# Altium footprint library Footprint-Lib-PhilsLab.PcbLib: 210 footprints (part 13 of 14)
Each footprint in its own frame and in the unit in brackets; x right, y up, seen from the top. Pads: shape width x height; smd on the part's side, far side on the other; paste and mask are expansions set on the pad; w line width, h text height; cw(c..) or ccw(c..) is an arc to the next point about the centre after c.
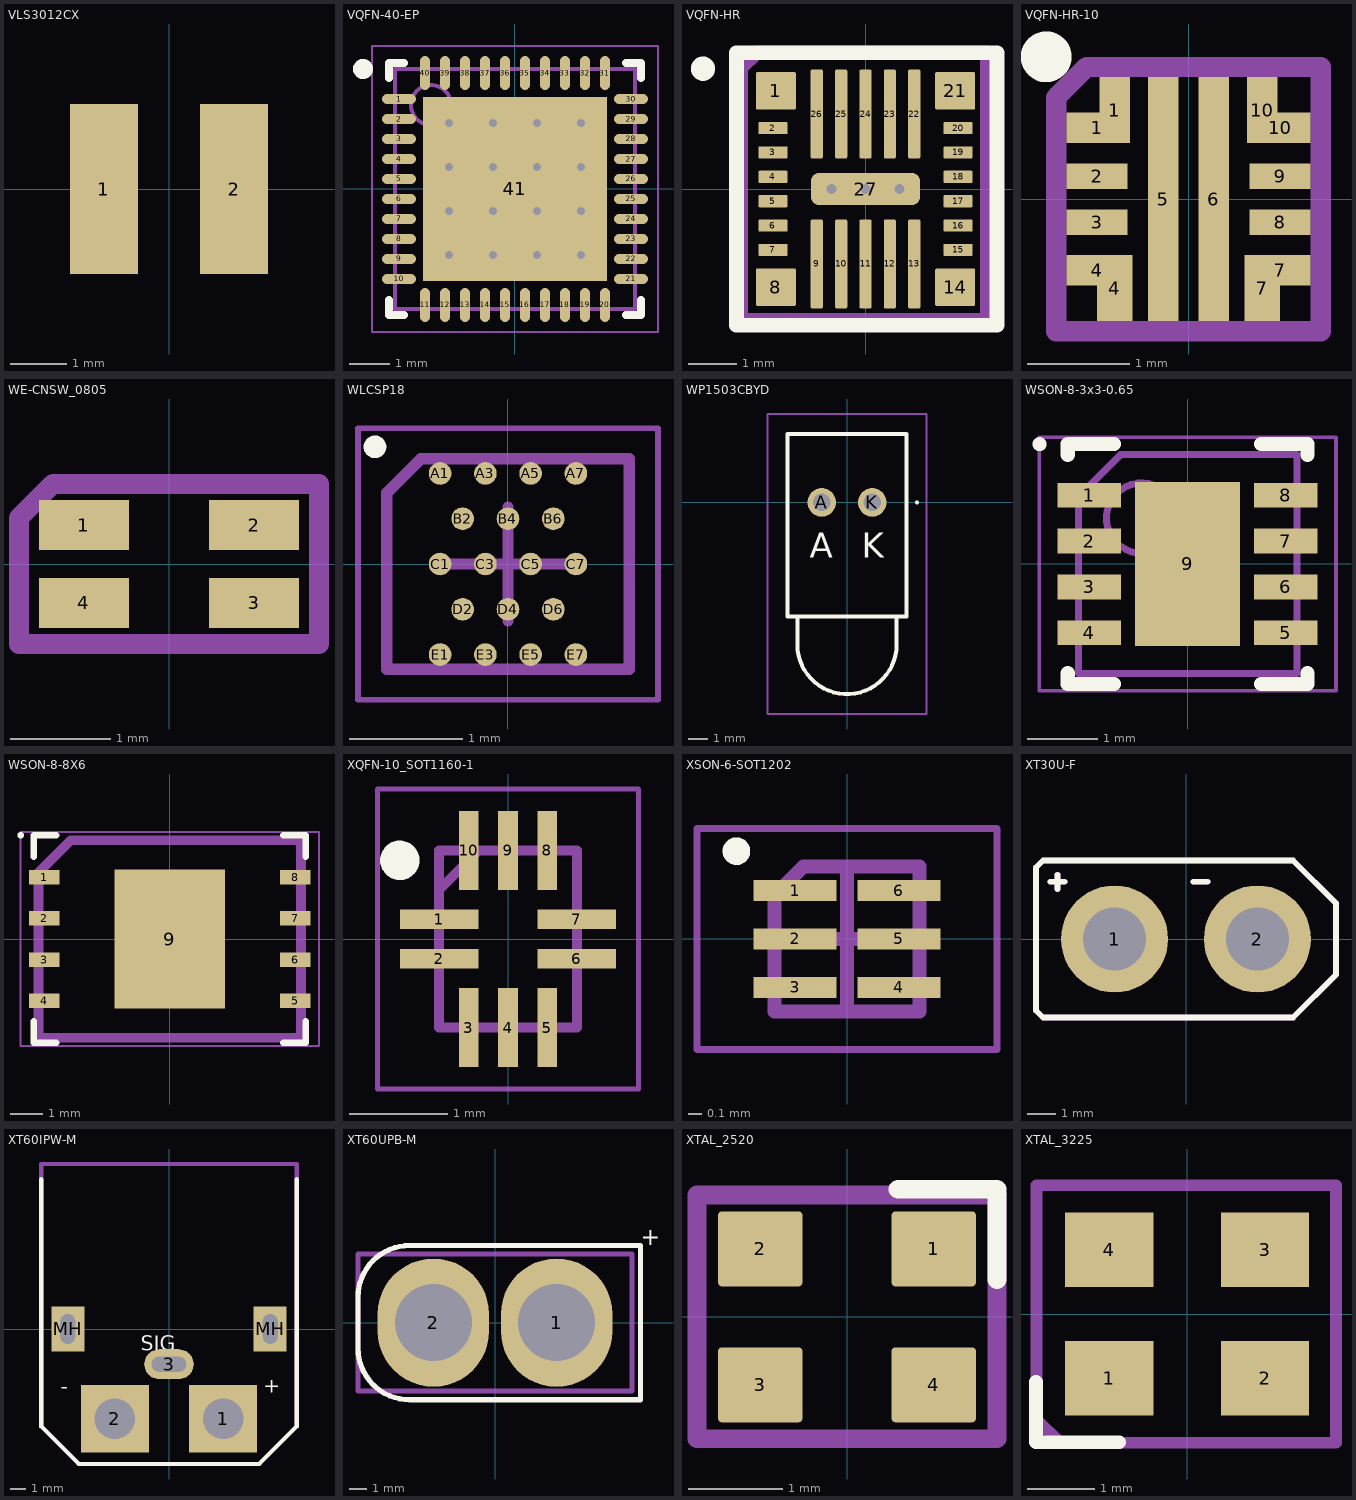
[diagram p12: the footprints below, top view; thin cyan lines are the x and y axes]

## VLS3012CX [mm]
pads (2):
  rect 1.2x3 smd: 1(-1.15,0) 2(1.15,0)
3D body "vls3012cx-1.step": height 1.21, standoff 0.01, extent -1.502,-1.509 1.502,1.509

## VQFN-40-EP [mm]
height 0.9
pads (41):
  oval 0.85x0.25 smd mask+0.2: 1(-2.9,2.25) 2(-2.9,1.75) 3(-2.9,1.25) 4(-2.9,0.75) 5(-2.9,0.25) 6(-2.9,-0.25) 7(-2.9,-0.75) 8(-2.9,-1.25) 9(-2.9,-1.75) 10(-2.9,-2.25) 21(2.9,-2.25) 22(2.9,-1.75) 23(2.9,-1.25) 24(2.9,-0.75) 25(2.9,-0.25) 26(2.9,0.25) 27(2.9,0.75) 28(2.9,1.25) 29(2.9,1.75) 30(2.9,2.25)
  oval 0.25x0.85 smd mask+0.2: 11(-2.25,-2.9) 12(-1.75,-2.9) 13(-1.25,-2.9) 14(-0.75,-2.9) 15(-0.25,-2.9) 16(0.25,-2.9) 17(0.75,-2.9) 18(1.25,-2.9) 19(1.75,-2.9) 20(2.25,-2.9) 31(2.25,2.9) 32(1.75,2.9) 33(1.25,2.9) 34(0.75,2.9) 35(0.25,2.9) 36(-0.25,2.9) 37(-0.75,2.9) 38(-1.25,2.9) 39(-1.75,2.9) 40(-2.25,2.9)
  rect 4.6x4.6 smd mask+0.2: 41(0,0)
via 1.65,-1.65 diameter 0.5 hole 0.2
via 0.55,-1.65 diameter 0.5 hole 0.2
via -0.55,-1.65 diameter 0.5 hole 0.2
via -1.65,-1.65 diameter 0.5 hole 0.2
via 1.65,-0.55 diameter 0.5 hole 0.2
via 0.55,-0.55 diameter 0.5 hole 0.2
via -0.55,-0.55 diameter 0.5 hole 0.2
via -1.65,-0.55 diameter 0.5 hole 0.2
via 1.65,0.55 diameter 0.5 hole 0.2
via 0.55,0.55 diameter 0.5 hole 0.2
via -0.55,0.55 diameter 0.5 hole 0.2
via -1.65,0.55 diameter 0.5 hole 0.2
via 1.65,1.65 diameter 0.5 hole 0.2
via 0.55,1.65 diameter 0.5 hole 0.2
via -0.55,1.65 diameter 0.5 hole 0.2
via -1.65,1.65 diameter 0.5 hole 0.2
Top Overlay:
  circle w0.25: c-3.8,3 r0.125
  lines w0.2: -3.15,-2.775 -3.15,-3.15 -2.775,-3.15 ; -3.15,2.775 -3.15,3.15 -2.775,3.15 ; 2.775,-3.15 3.15,-3.15 3.15,-2.775 ; 2.775,3.15 3.15,3.15 3.15,2.775
Mechanical 13:
  circle w0.1: c-2.1,2.1 r0.5
  lines w0.1: -3,-3 3,-3 3,3 -3,3 -3,-3
  text "'.Designator'" at -6.315,-1.4 h1
Mechanical 15:
  lines w0.05: -3.575,-3.575 3.575,-3.575 3.575,3.575 -3.575,3.575 -3.575,-3.575
  lines w0.1: -0.5,0 0.5,0 ; 0,-0.5 0,0.5
3D body "VQFN-40-EP.step": height 0.9, standoff 0, extent -3.001,-3.001 3.001,3.001

## VQFN-HR [mm]
pads (27):
  rrect10% 0.825x0.775 smd mask+0.07: 1(-1.84,2.015) 8(-1.84,-2.015) 14(1.84,-2.015) 21(1.84,2.015)
  rrect20% 0.6x0.25 smd mask+0.07: 2(-1.9,1.25) 3(-1.9,0.75) 4(-1.9,0.25) 5(-1.9,-0.25) 6(-1.9,-0.75) 7(-1.9,-1.25) 15(1.9,-1.25) 16(1.9,-0.75) 17(1.9,-0.25) 18(1.9,0.25) 19(1.9,0.75) 20(1.9,1.25)
  rrect20% 0.25x1.82 smd mask+0.07: 9(-1,-1.54) 10(-0.5,-1.54) 11(0,-1.54) 12(0.5,-1.54) 13(1,-1.54) 22(1,1.54) 23(0.5,1.54) 24(0,1.54) 25(-0.5,1.54) 26(-1,1.54)
  rrect50% 2.24x0.66 smd mask+0.07: 27(0,0)
via 0.7,0 diameter 0.5 hole 0.2
via -0.7,0 diameter 0.5 hole 0.2
via 0,0 diameter 0.5 hole 0.2
Top Overlay:
  circle w0.254: c-3.339,2.47 r0.121
  lines w0.3: -2.65,-2.8 2.7,-2.8 2.7,2.8 -2.65,2.8 -2.65,-2.8
Mechanical 13:
  circle w0.254: c-1.85,2.021 r0.117
  lines w0.3: -2.559,-2.7 2.5,-2.7 2.5,2.8 -2.247,2.8 -2.559,2.487 -2.559,-2.7
  text "'.Designator'" at -5.84,-0.925 h1
3D body "VQFN-HR.stp": height 0.9, standoff 0, extent -2,-2.25 2,2.25

## VQFN-HR-10 [mm]
pads (14):
  rect 0.6x0.3 smd: 1(-0.9,0.7) 4(-0.9,-0.7) 7(0.9,-0.7) 10(0.9,0.7)
  rect 0.3x0.65 smd: 1(-0.725,0.875) 10(0.725,0.875)
  rect 0.6x0.25 smd: 2(-0.9,0.225) 3(-0.9,-0.225) 8(0.9,-0.225) 9(0.9,0.225)
  rect 0.35x0.65 smd: 4(-0.725,-0.875) 7(0.725,-0.875)
  rect 0.3x2.4 smd: 5(-0.25,0) 6(0.25,0)
Top Overlay:
  circle w0.3: c-1.4,1.4 r0.1
Mechanical 13:
  lines w0.2: -1.3,-1.3 -1.3,0.2 -1.3,1 -1,1.3 1.3,1.3 1.3,-1.3 -1.3,-1.3
  text "'.Designator'" at -6.315,-1.4 h1
3D body "VQFN-HR-10P.STEP": height 1.01, standoff -0.01, extent -1.05,-1.05 1.05,1.05

## WE-CNSW_0805 [mm]
pads (4):
  rect 0.9x0.5 smd mask+0.05: 1(-0.85,0.39) 2(0.85,0.39) 3(0.85,-0.39) 4(-0.85,-0.39)
Mechanical 13:
  lines w0.2: -1.5,-0.8 -1.5,0.462 -1.162,0.8 1.5,0.8 1.5,-0.8 -1.5,-0.8
  text "'.Designator'" at -5.815,-0.9 h1
3D body "WE-CNSW_0805.stp": height 1.21, standoff 0.01, extent -1,-0.6 1,0.6

## WLCSP18 [mm]
height 0.59
pads (18):
  round 0.2 smd mask+0.03: A1(-0.6,0.8) A3(-0.2,0.8) A5(0.2,0.8) A7(0.6,0.8) B2(-0.4,0.4) B4(0,0.4) B6(0.4,0.4) C1(-0.6,0) C3(-0.2,0) C5(0.2,0) C7(0.6,0) D2(-0.4,-0.4) D4(0,-0.4) D6(0.4,-0.4) E1(-0.6,-0.8) E3(-0.2,-0.8) E5(0.2,-0.8) E7(0.6,-0.8)
Top Overlay:
  circle w0.1: c-1.175,1.035 r0.05
Mechanical 13:
  lines w0.1: -1.07,-0.93 -1.07,0.63 -0.77,0.93 1.07,0.93 1.07,-0.93 -1.07,-0.93
  text "'.Designator'" at -5.815,-0.9 h1
Mechanical 15:
  lines w0.05: -1.325,-1.2 1.325,-1.2 1.325,1.2 -1.325,1.2 -1.325,-1.2
  lines w0.1: -0.5,0 0.5,0 ; 0,-0.5 0,0.5
3D body "WLCSP18.step": height 0.59, standoff 0, extent -1.07,-0.93 1.07,0.93

## WP1503CBYD [mm]
pads (2):
  round 1.445 hole 0.889: A(-1.27,0) K(1.27,0)
Top Overlay:
  lines w0.1: 3.47,0 ccw(c3.52,0) 3.57,0 ccw(c3.52,0) 3.47,0
  lines w0.2: -2.5,-5.75 -2.5,-7.15 ccw(c0,-7.15) 2.5,-7.15 2.5,-5.75 ; -3,-5.75 3,-5.75 3,3.45 -3,3.45 -3,-5.75
  text "K" at 0.733,-2.775 h1.25
  text "A" at -1.867,-2.775 h1.25
Mechanical 13:
  lines w0.1: -2.5,-5.75 -2.5,-7.15 ccw(c0,-7.15) 2.5,-7.15 2.5,-5.75 ; -3,-5.75 3,-5.75 3,3.45 -3,3.45 -3,-5.75
  text "'.Designator'" at -7.231,-0.987 h1.25
Mechanical 15:
  lines w0.1: -4,-10.65 4,-10.65 4,4.45 -4,4.45 -4,-10.65
3D body "1503CB.STEP": height 6.01, standoff -3.49, extent -3,-9.75 3,3.45

## WSON-8-3x3-0.65 [mm] "SON, 8-Leads, Body 3.00x3.00mm, Pitch 0.65mm, Thermal Pad 2.33x1.49mm, IPC Medium Density"
height 1
pads (9):
  rect 0.9x0.35 smd: 1(-1.395,0.975) 2(-1.395,0.325) 3(-1.395,-0.325) 4(-1.395,-0.975) 5(1.395,-0.975) 6(1.395,-0.325) 7(1.395,0.325) 8(1.395,0.975)
  rect 1.49x2.33 smd: 9(0,0)
Top Overlay:
  circle w0.1: c-2.1,1.7 r0.05
  lines w0.2: -1.7,-1.55 -1.7,-1.7 -1.045,-1.7 ; -1.7,1.55 -1.7,1.7 -1.045,1.7 ; 1.045,-1.7 1.7,-1.7 1.7,-1.55 ; 1.045,1.7 1.7,1.7 1.7,1.55
Mechanical 13:
  circle w0.1: c-0.65,0.65 r0.5
  lines w0.1: -1.55,-1.55 1.55,-1.55 1.55,1.55 -0.95,1.55 -1.55,0.95 -1.55,-1.55
  text "'.Designator'" at -5.665,-0.317 h1
Mechanical 15:
  lines w0.05: -2.105,-1.8 -2.105,1.8 2.105,1.8 2.105,-1.8 -2.105,-1.8
  lines w0.1: -0.5,0 0.5,0 ; 0,-0.5 0,0.5
3D body "WSON-8-3x3-0.65.step": height 1, standoff 0, extent -1.551,-1.55 1.551,1.55

## WSON-8-8X6 [mm] "8-Pad WSON 8x6-mm (Package Code E) (Winbond)"
height 0.8
pads (9):
  rect 0.95x0.45 smd: 1(-3.87,1.905) 2(-3.87,0.635) 3(-3.87,-0.635) 4(-3.87,-1.905) 5(3.87,-1.905) 6(3.87,-0.635) 7(3.87,0.635) 8(3.87,1.905)
  rect 3.4x4.3 smd paste-1.7: 9(0,0)
Top Overlay:
  circle w0.1: c-4.6,3.2 r0.05
  lines w0.2: -4.2,-2.53 -4.2,-3.2 -3.495,-3.2 ; -4.2,2.53 -4.2,3.2 -3.495,3.2 ; 3.495,-3.2 4.2,-3.2 4.2,-2.53 ; 3.495,3.2 4.2,3.2 4.2,2.53
Top Paste:
  rectangle: -1.595,0.815 -0.665,2.045
  rectangle: -1.595,-0.615 -0.665,0.615
  rectangle: -1.595,-2.045 -0.665,-0.815
  rectangle: -0.465,0.815 0.465,2.045
  rectangle: -0.465,-0.615 0.465,0.615
  rectangle: -0.465,-2.045 0.465,-0.815
  rectangle: 0.665,0.815 1.595,2.045
  rectangle: 0.665,-0.615 1.595,0.615
  rectangle: 0.665,-2.045 1.595,-0.815
Mechanical 13:
  lines w0.3: -4.05,-3.05 -4.05,2.05 -3.05,3.05 4.05,3.05 4.05,-3.05 -4.05,-3.05
  text "'.Designator'" at -5.84,-0.925 h1
Mechanical 15:
  lines w0.05: -4.605,-3.3 -4.605,3.3 4.605,3.3 4.605,-3.3 -4.605,-3.3
  lines w0.1: -0.5,0 0.5,0 ; 0,-0.5 0,0.5
3D body "WSON-8-8X6.step": height 0.8, standoff 0, extent -4.051,-3.05 4.051,3.05

## XQFN-10_SOT1160-1 [mm]
pads (10):
  rect 0.8x0.2 smd mask+0.05: 1(-0.7,0.2) 2(-0.7,-0.2) 6(0.7,-0.2) 7(0.7,0.2)
  rect 0.2x0.8 smd mask+0.05: 3(-0.4,-0.9) 4(0,-0.9) 5(0.4,-0.9) 8(0.4,0.9) 9(0,0.9) 10(-0.4,0.9)
Top Overlay:
  circle w0.2: c-1.1,0.8 r0.1
Mechanical 13:
  lines w0.1: -0.7,0.5 -0.3,0.9 ; -0.7,-0.9 -0.7,0.9 0.7,0.9 0.7,-0.9 -0.7,-0.9
  text "'.Designator'" at -5.84,-0.925 h1
Mechanical 15:
  lines w0.05: -1.325,-1.525 -1.325,1.525 1.325,1.525 1.325,-1.525 -1.325,-1.525
3D body "NX3DV42GU,115.stp": height 0.5, standoff 0, extent -0.75,-0.95 0.75,0.95

## XSON-6-SOT1202 [mm] "SON, 6-Leads, Body 0.98x1.00mm, Pitch 0.35mm, IPC Medium Density"
height 0.35
pads (6):
  rect 0.6x0.15 smd mask+0.05: 1(-0.375,0.35) 2(-0.375,0) 3(-0.375,-0.35) 4(0.375,-0.35) 5(0.375,0) 6(0.375,0.35)
Top Overlay:
  circle w0.1: c-0.8,0.635 r0.05
Mechanical 13:
  lines w0.1: -0.525,-0.525 -0.525,0.316 -0.316,0.525 0.525,0.525 0.525,-0.525 -0.525,-0.525
  text "'.Designator'" at -5.84,-0.925 h1
Mechanical 15:
  lines w0.05: -1.085,-0.8 1.085,-0.8 1.085,0.8 -1.085,0.8 -1.085,-0.8
  lines w0.1: -0.5,0 0.5,0 ; 0,-0.5 0,0.5
3D body "XSON-6.step": height 0.39, standoff 0, extent -0.5,-0.5 0.5,0.5

## XT30U-F [mm]
pads (2):
  round 3.75 hole 2.2: 1(-2.5,0) 2(2.5,0)
Top Overlay:
  lines w0.2: -4.75,2 -4.25,2 ; -4.5,1.75 -4.5,2.25 ; 0.25,2 0.75,2 ; -5.25,-2.5 -5,-2.75 3.75,-2.75 5.25,-1.25 5.25,1.25 3.75,2.75 -5,2.75 -5.25,2.5 -5.25,0.25 -5.25,-2.5
Mechanical 13:
  lines w0.2: -4.75,2 -4.25,2 ; -4.5,1.75 -4.5,2.25 ; 0.25,2 0.75,2 ; -5.25,-2.5 -5,-2.75 3.75,-2.75 5.25,-1.25 5.25,1.25 3.75,2.75 -5,2.75 -5.25,2.5 -5.25,0.25 -5.25,-2.5
  text "'.Designator'" at -6.315,-1.4 h1
3D body "XT30U-F.step": height 12.61, standoff -2.99, extent -5.225,-2.625 5.225,2.625
3D body "XT30U-F.stp": height 0, standoff 0, extent 13.25,9.75 13.25,9.75

## XT60IPW-M [mm]
pads (5):
  rect 4.5x4.5 hole 2.7: 1(3.6,-6) 2(-3.6,-6)
  rrect100% 3.3x2 hole 1 slot 2.3 at 0 deg: 3(0,-2.35)
  rect 2.2x3 hole 1 slot 2 at 90 deg: MH(-6.75,0) MH(6.75,0)
Top Overlay:
  lines w0.3: -8.5,10 -8.5,-6.5 -6,-9 6,-9 8.5,-6.5 8.5,10
  text "+" at 6.267,-4.242 h1
  text "-" at -7.233,-4.325 h1
  text "SIG" at -1.9,-1.45 h1
Mechanical 13:
  lines w0.3: -8.5,-6.5 -6,-9 6,-9 8.5,-6.5 8.5,11 -8.5,11 -8.5,-6.5
  text "'.Designator'" at -6.315,-1.4 h1
  text "+" at 2.184,-7.408 h2
  text "-" at -4.816,-7.575 h2
3D body "XT60IPW-M.STEP": height 8.41, standoff -2.54, extent -7.75,-7.25 7.75,10.35

## XT60UPB-M [mm]
pads (2):
  oval 6.5x7.5 hole 4.5 paste-1: 1(3.6,0) 2(-3.6,0)
Top Overlay:
  lines w0.3: -8,-1.5 ccw(c-5,-1.5) -5,-4.5 8.5,-4.5 8.5,4.5 -5,4.5 ccw(c-5,1.5) -8,1.5 -8,-1.5
  text "+" at 8.517,4.508 h1
Mechanical 13:
  lines w0.3: -8,-4 8,-4 8,4 -8,4 -8,-4
  text "'.Designator'" at -5.815,-0.9 h1
  text "+" at 1.185,2.1 h1
3D body "XT60UPB-M.step": height 13.51, standoff -2.09, extent -7.692,-3.95 7.65,3.95

## XTAL_2520 [mm]
pads (4):
  rrect10% 0.9x0.8 smd mask+0: 1(0.925,0.725) 2(-0.925,0.725) 3(-0.925,-0.725) 4(0.925,-0.725)
Top Overlay:
  lines w0.2: 0.544,1.362 1.6,1.362 1.6,0.4
Mechanical 13:
  circle w0.25: c0.951,0.73 r0.1
  lines w0.2: -1.6,-1.3 -1.6,1.3 1.6,1.3 1.6,-1.3 -1.6,-1.3
  text "'.Designator'" at -5.84,-0.925 h1
3D body "XTAL-2520.step": height 0.8, standoff -0.03, extent -1.25,-1 1.25,1

## XTAL_3225 [mm]
pads (4):
  rect 1.3x1.1 smd: 1(-1.15,-0.95) 2(1.15,-0.95) 3(1.15,0.95) 4(-1.15,0.95)
Top Overlay:
  lines w0.2: -2.231,-1 -2.231,-1.893 -1,-1.893
Mechanical 13:
  circle w0.254: c-1.15,-0.95 r0.112
  lines w0.175: -0.478,1.903 2.197,1.903 2.197,-1.9 -1.875,-1.9 -2.225,-1.55 -2.225,1.903 0.472,1.903
  text "'.Designator'" at -5.665,-0.417 h1
3D body "Y3225.step": height 0.61, standoff 0, extent -1.6,-1.275 1.6,1.225